# Altium footprint library 大彩串口屏.PcbLib: 8 footprints
Each footprint in its own frame and in the unit in brackets; x right, y up, seen from the top. Pads: shape width x height; smd on the part's side, far side on the other; paste and mask are expansions set on the pad; w line width, h text height; cw(c..) or ccw(c..) is an arc to the next point about the centre after c.
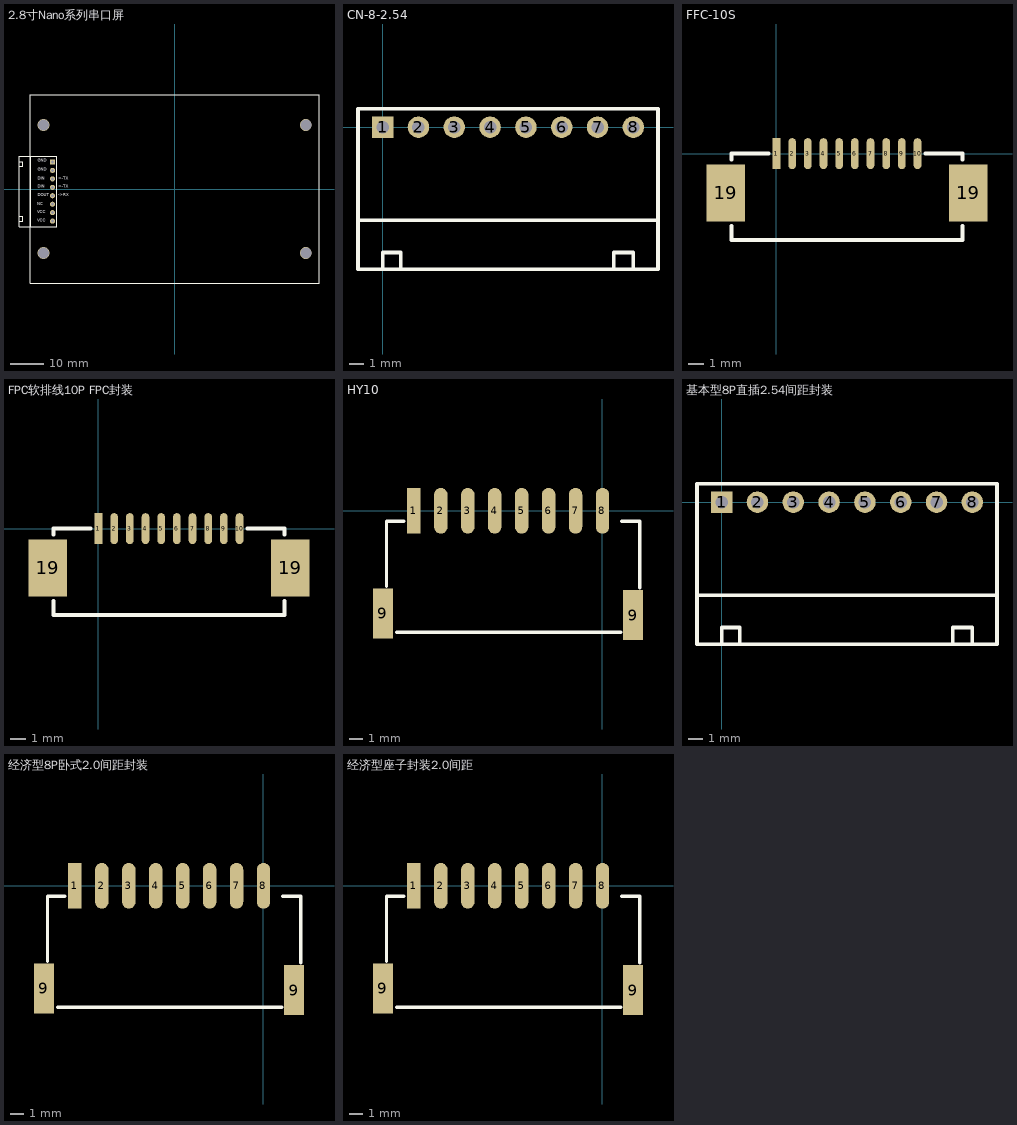
[diagram p0: the footprints below, top view; thin cyan lines are the x and y axes]

## 2.8寸Nano系列串口屏 [mil]
pads (8):
  rect 60x60 hole 35: 1(-1445,320)
  round 60 hole 35: 2(-1445,220) 3(-1445,120) 4(-1445,20) 5(-1445,-80) 6(-1445,-180) 7(-1445,-280) 8(-1445,-380)
via -1551.18,757.87 diameter 137.8 hole 129.92
via 1551.18,757.87 diameter 137.8 hole 129.92
via -1551.18,-757.87 diameter 137.8 hole 129.92
via 1551.18,-757.87 diameter 137.8 hole 129.92
Top Overlay:
  lines w10: -1841.69,-448.9 -1841.69,388.9 -1704.84,388.9 ; -1841.69,-380 -1795,-380 -1795,-325 -1836.69,-325 ; -1841.69,270 -1795,270 -1795,320 -1841.69,320 ; -1840,-448.9 -1704.84,-448.9 ; -1395,388.9 -1704.84,388.9 ; -1393.82,388.9 -1393.82,-448.9 -1704.84,-448.9 ; -1704.84,-448.9 -1704.84,388.9 ; -1706.69,-1114.17 1706.69,-1114.17 1706.69,1114.17 -1706.69,1114.17 -1706.69,-1114.17
  text "VCC" at -1625,-400 h60
  text "VCC" at -1625,-300 h60
  text "NC" at -1625,-205 h60
  text "DOUT" at -1620,-100 h60
  text "DIN" at -1620,5 h60
  text "DIN" at -1620,100 h60
  text "GND" at -1620,205 h60
  text "GND" at -1620,310 h60
  text "->RX" at -1380,-100 h60
  text "<-TX" at -1380,5 h60
  text "<-TX" at -1380,100 h60

## CN-8-2.54 [mil] "基本型8P直插2.54间距封装"
pads (8):
  rect 60x60 hole 35: 1(0,0)
  round 60 hole 35: 2(100,0) 3(200,0) 4(300,0) 5(400,0) 6(500,0) 7(600,0) 8(700,0)
Top Overlay:
  lines w10: -68.9,50 -68.9,-259.84 ; -68.9,51.18 768.9,51.18 768.9,-259.84 ; 0,-396.69 0,-350 50,-350 50,-396.69 ; 645,-391.69 645,-350 700,-350 700,-396.69 ; 768.9,-396.69 -68.9,-396.69 -68.9,-259.84 ; 768.9,-395 768.9,-259.84 ; -68.9,-259.84 768.9,-259.84

## FFC-10S [mm] "FPC软排线10P FPC封装"
height 11.5
pads (12):
  rect 0.5x2 smd: 1(0,0)
  oval 0.5x2 smd: 2(1.016,0) 3(2.032,0) 4(3.048,0) 5(4.064,0) 6(5.08,0) 7(6.096,0) 8(7.112,0) 9(8.128,0) 10(9.144,0)
  rect 2.5x3.7 smd: 19(-3.302,-2.54) 19(12.446,-2.54)
Top Overlay:
  lines w0.254: -2.921,-4.699 -2.921,-5.588 12.065,-5.588 12.065,-4.699 ; -2.921,-0.381 -2.921,0 -0.508,0 ; 9.652,0 12.065,0 12.065,-0.381

## FPC软排线10P FPC封装 [mm] "FPC软排线10P FPC封装"
height 11.5
pads (12):
  rect 0.5x2 smd: 1(0,0)
  oval 0.5x2 smd: 2(1.016,0) 3(2.032,0) 4(3.048,0) 5(4.064,0) 6(5.08,0) 7(6.096,0) 8(7.112,0) 9(8.128,0) 10(9.144,0)
  rect 2.5x3.7 smd: 19(-3.302,-2.54) 19(12.446,-2.54)
Top Overlay:
  lines w0.254: -2.921,-4.699 -2.921,-5.588 12.065,-5.588 12.065,-4.699 ; -2.921,-0.381 -2.921,0 -0.508,0 ; 9.652,0 12.065,0 12.065,-0.381

## HY10 [mm] "经济型8P卧式2.0间距封装"
height 11.5
pads (10):
  rect 1x3.4 smd: 1(-13.97,0)
  oval 1x3.4 smd: 2(-11.97,0) 3(-9.97,0) 4(-7.97,0) 5(-5.97,0) 6(-3.97,0) 7(-1.97,0) 8(0.03,0)
  rect 1.5x3.7 smd: 9(-16.27,-7.62) 9(2.3,-7.747)
Top Overlay:
  lines w0.254: -16.002,-5.588 -16.002,-0.889 ; -16.002,-0.762 -14.707,-0.762 ; -15.24,-9.017 1.397,-9.017 ; 1.462,-0.762 2.757,-0.762 ; 2.794,-5.715 2.794,-0.762

## 基本型8P直插2.54间距封装 [mil] "基本型8P直插2.54间距封装"
pads (8):
  rect 60x60 hole 35: 1(0,0)
  round 60 hole 35: 2(100,0) 3(200,0) 4(300,0) 5(400,0) 6(500,0) 7(600,0) 8(700,0)
Top Overlay:
  lines w10: -68.9,50 -68.9,-259.84 ; -68.9,51.18 768.9,51.18 768.9,-259.84 ; 0,-396.69 0,-350 50,-350 50,-396.69 ; 645,-391.69 645,-350 700,-350 700,-396.69 ; 768.9,-396.69 -68.9,-396.69 -68.9,-259.84 ; 768.9,-395 768.9,-259.84 ; -68.9,-259.84 768.9,-259.84

## 经济型8P卧式2.0间距封装 [mm] "经济型8P卧式2.0间距封装"
height 11.5
pads (10):
  rect 1x3.4 smd: 1(-13.97,0)
  oval 1x3.4 smd: 2(-11.97,0) 3(-9.97,0) 4(-7.97,0) 5(-5.97,0) 6(-3.97,0) 7(-1.97,0) 8(0.03,0)
  rect 1.5x3.7 smd: 9(-16.27,-7.62) 9(2.3,-7.747)
Top Overlay:
  lines w0.254: -16.002,-5.588 -16.002,-0.889 ; -16.002,-0.762 -14.707,-0.762 ; -15.24,-9.017 1.397,-9.017 ; 1.462,-0.762 2.757,-0.762 ; 2.794,-5.715 2.794,-0.762

## 经济型座子封装2.0间距 [mm] "经济型座子封装2.0间距 8P卧式贴片封装"
height 11.5
pads (10):
  rect 1x3.4 smd: 1(-13.97,0)
  oval 1x3.4 smd: 2(-11.97,0) 3(-9.97,0) 4(-7.97,0) 5(-5.97,0) 6(-3.97,0) 7(-1.97,0) 8(0.03,0)
  rect 1.5x3.7 smd: 9(-16.27,-7.62) 9(2.3,-7.747)
Top Overlay:
  lines w0.254: -16.002,-5.588 -16.002,-0.889 ; -16.002,-0.762 -14.707,-0.762 ; -15.24,-9.017 1.397,-9.017 ; 1.462,-0.762 2.757,-0.762 ; 2.794,-5.715 2.794,-0.762